# Altium footprint library Horizont_11_12_2017.PcbLib: 257 footprints (part 7 of 17)
Each footprint in its own frame and in the unit in brackets; x right, y up, seen from the top. Pads: shape width x height; smd on the part's side, far side on the other; paste and mask are expansions set on the pad; w line width, h text height; cw(c..) or ccw(c..) is an arc to the next point about the centre after c.
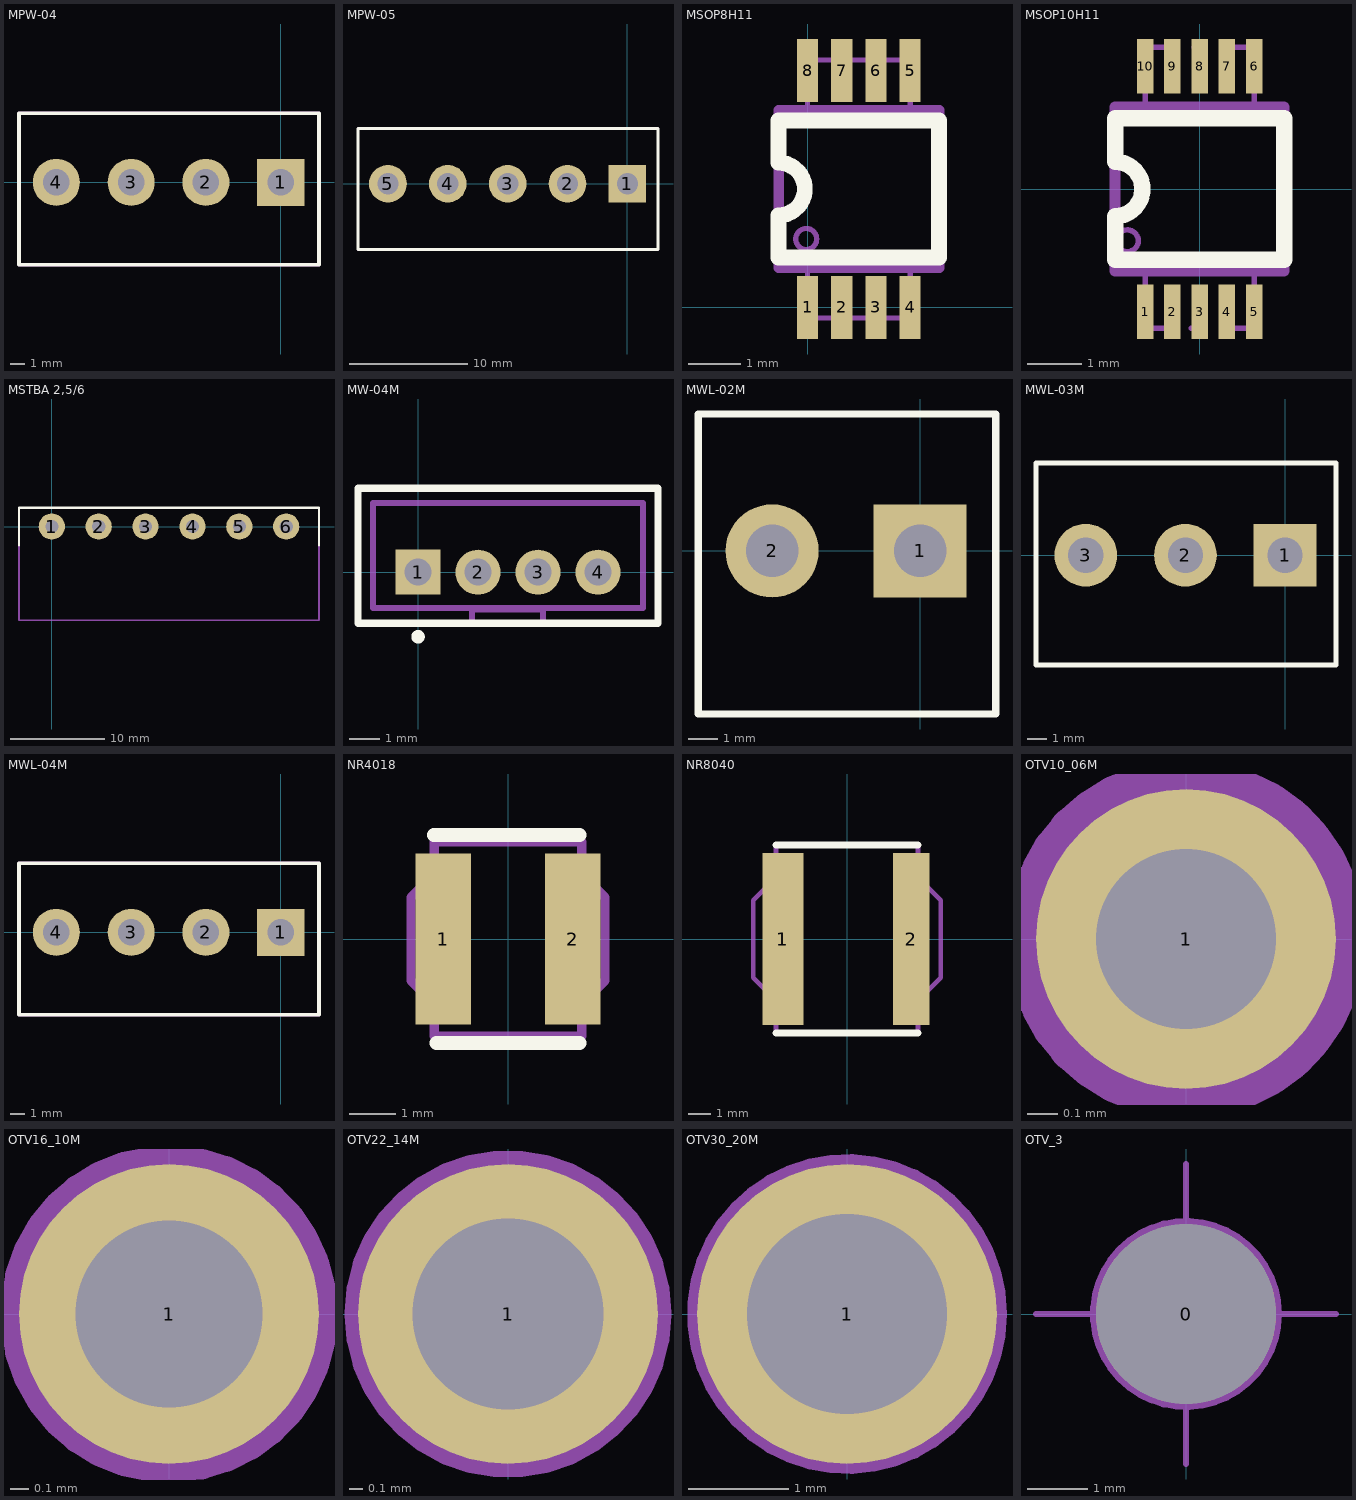
[diagram p6: the footprints below, top view; thin cyan lines are the x and y axes]

## MPW-04 [mm]
height 13.9
pads (4):
  rect 3.2x3.2 hole 1.8: 1(0,0)
  round 3.2 hole 1.8: 2(-5.08,0) 3(-10.16,0) 4(-15.24,0)
Top Overlay:
  lines w0.25: -17.78,-5.6 -17.78,4.7 2.6,4.7 2.6,-5.6 -17.78,-5.6
Mechanical 1:
  lines w0.2: -17.78,-5.6 2.6,-5.6 2.6,4.7 -17.78,4.7 -17.78,-5.6
  text "4" at -15.2,-0.5 h1.5
  text "1" at 0,-0.5 h1.5
  text ".Designator" at -10,3.1 h1.5
3D body "MPW-04.stp": height 13.7, standoff -3.3, extent -17.81,-5.57 2.57,4.63

## MPW-05 [mm]
height 13.9
pads (5):
  rect 3.2x3.2 hole 1.8: 1(0,0)
  round 3.2 hole 1.8: 2(-5.08,0) 3(-10.16,0) 4(-15.24,0) 5(-20.32,0)
Top Overlay:
  lines w0.25: -22.86,-5.6 -22.86,4.7 2.6,4.7 2.6,-5.6 -22.86,-5.6
Mechanical 1:
  lines w0.2: -22.86,-5.6 2.6,-5.6 2.6,4.7 -22.86,4.7 -22.86,-5.6
  text "5" at -20.6,-0.3 h1.5
  text "1" at 0,-0.5 h1.5
  text ".Designator" at -13,3.1 h1.5
3D body "MPW-05.stp": height 13.7, standoff -3.3, extent -22.89,-5.57 2.57,4.63

## MSOP8H11 [mm]
height 1.1
pads (8):
  rect 0.4x1.2 smd: 1(0,0) 2(0.65,0) 3(1.3,0) 4(1.95,0) 5(1.95,4.5) 6(1.3,4.5) 7(0.65,4.5) 8(0,4.5)
Top Overlay:
  lines w0.3: -0.55,0.95 2.5,0.95 2.5,3.55 -0.55,3.55 -0.55,2.75 cw(c-0.55,2.25) -0.55,1.75 -0.55,0.95
Mechanical 1:
  circle w0.1: c-0.025,1.3 r0.2
  lines w0.1: 0,0.75 0,-0.2 0.55,-0.2 ; 0,3.75 0,4.7 0.55,4.7 ; 0.85,-0.2 1.1,-0.2 ; 0.85,4.7 1.1,4.7 ; 1.4,-0.2 1.95,-0.2 1.95,0.75 ; 1.4,4.7 1.95,4.7 1.95,3.75
  lines w0.2: -0.55,0.75 2.5,0.75 2.5,3.75 -0.55,3.75 -0.55,0.75
  text ".Designator" at 0.2,5.18 h1.5
  text ".Comment" at -1.67,-1.45 h1.5
  text "8" at -0.127,2.413 h1.5
3D body "MSOP8h11.stp": height 1.11, standoff 0, extent -0.525,-0.2 2.475,4.7

## MSOP10H11 [mm]
height 1.1
pads (10):
  rect 0.3x1 smd: 1(-1,-2.25) 2(-0.5,-2.25) 3(0,-2.25) 4(0.5,-2.25) 5(1,-2.25) 6(1,2.25) 7(0.5,2.25) 8(0,2.25) 9(-0.5,2.25) 10(-1,2.25)
Top Overlay:
  lines w0.3: -1.55,-1.3 1.55,-1.3 1.55,1.3 -1.55,1.3 -1.55,0.5 cw(c-1.55,0) -1.55,-0.5 -1.55,-1.3
Mechanical 1:
  circle w0.1: c-1.325,-0.95 r0.2
  lines w0.1: -1.3,1.5 -1,1.5 -1,2.6 -0.45,2.6 ; -1,-1.5 -1,-1.65 -1,-2.55 -0.45,-2.55 ; -0.15,-2.55 0.1,-2.55 ; -0.1,2.6 0.1,2.6 ; 0.45,-2.55 1,-2.55 1,-1.5 ; 0.45,2.6 1,2.6 1,1.5 1.3,1.5
  lines w0.2: -1.55,-1.5 1.55,-1.5 1.55,1.5 -1.55,1.5 -1.55,-1.5
  text "10" at -1.427,0.163 h1.5
  text ".Comment" at -2.55,-3.95 h1.5
  text ".Designator" at -0.81,-0.95 h1.5
3D body "MSOP10h11.stp": height 1.11, standoff 0, extent -1.55,-2.55 1.55,2.55

## MSTBA 2,5/6 [mm]
height 8.35
pads (6):
  round 2.8 hole 1.4: 1(0,0) 2(5,0) 3(10,0) 4(15,0) 5(20,0) 6(25,0)
Top Overlay:
  lines w0.25: -3.5,-2 -3.5,2 28.5,2 28.5,-2
Mechanical 1:
  lines w0.2: -3.5,-10 28.5,-10 28.5,2 -3.5,2 -3.5,-10
  text "6" at 25,-0.5 h1.5
  text "1" at 0,-0.5 h1.5
  text ".Designator" at 10,-4 h1.5
3D body "MSTBA 2,5_6-G.STEP": height 8.35, standoff -3.6, extent -3.5,-10 28.5,2

## MW-04M [mm]
height 6
pads (4):
  rect 1.5x1.5 hole 0.9: 1(0,0)
  round 1.5 hole 0.9: 2(2,0) 3(4,0) 4(6,0)
Top Overlay:
  circle w0.25: c0,-2.15 r0.1
  lines w0.25: -2,-1.7 8,-1.7 8,2.8 -2,2.8 -2,-1.7
Mechanical 1:
  lines w0.2: 1.8,-1.7 1.8,-1.25 4.175,-1.25 4.175,-1.7 ; -2,-1.7 8,-1.7 8,2.8 -2,2.8 -2,-1.7 ; -1.5,-1.2 7.5,-1.2 7.5,2.3 -1.5,2.3 -1.5,-1.2
  text ".Designator" at 1.5,3.3 h1.5
  text "1" at -0.5,-0.5 h1.5
  text "4" at 5.7,-0.525 h1.5
3D body "MW-04M.STEP": height 6, standoff -3, extent -2,-1.7 8,2.8

## MWL-02M [mm]
height 13.9
pads (2):
  rect 3.2x3.2 hole 1.8: 1(0,0)
  round 3.2 hole 1.8: 2(-5.08,0)
Top Overlay:
  lines w0.25: -7.62,-5.6 -7.62,4.7 2.6,4.7 2.6,-5.6 -7.62,-5.6
Mechanical 1:
  lines w0.2: -7.62,-5.6 2.6,-5.6 2.6,4.7 -7.62,4.7 -7.62,-5.6
  text "2" at -5.334,-0.254 h1.5
  text "1" at 0,-0.5 h1.5
  text ".Designator" at -4.445,3.048 h1.5
3D body "MPW-02.stp": height 13.7, standoff -3.3, extent -7.65,-5.57 2.57,4.63

## MWL-03M [mm]
height 13.9
pads (3):
  rect 3.2x3.2 hole 1.8: 1(0,0)
  round 3.2 hole 1.8: 2(-5.08,0) 3(-10.16,0)
Top Overlay:
  lines w0.25: -12.7,-5.6 -12.7,4.7 2.6,4.7 2.6,-5.6 -12.7,-5.6
Mechanical 1:
  lines w0.2: -12.7,-5.6 2.6,-5.6 2.6,4.7 -12.7,4.7 -12.7,-5.6
  text "3" at -10.3,-0.35 h1.5
  text "1" at 0,-0.5 h1.5
  text ".Designator" at -7.62,3.175 h1.5
3D body "MPW-03.stp": height 13.7, standoff -3.3, extent -12.73,-5.57 2.57,4.63

## MWL-04M [mm]
height 13.9
pads (4):
  rect 3.2x3.2 hole 1.8: 1(0,0)
  round 3.2 hole 1.8: 2(-5.08,0) 3(-10.16,0) 4(-15.24,0)
Top Overlay:
  lines w0.25: -17.78,-5.6 -17.78,4.7 2.6,4.7 2.6,-5.6 -17.78,-5.6
Mechanical 1:
  lines w0.2: -17.78,-5.6 2.6,-5.6 2.6,4.7 -17.78,4.7 -17.78,-5.6
  text "4" at -15.2,-0.5 h1.5
  text "1" at 0,-0.5 h1.5
  text ".Designator" at -10,3.1 h1.5
3D body "MPW-04.stp": height 13.7, standoff -3.3, extent -17.81,-5.57 2.57,4.63

## NR4018 [mm]
height 1.8
pads (2):
  rect 1.2x3.7 smd: 1(-1.4,0) 2(1.4,0)
Top Overlay:
  lines w0.3: -1.6,2.25 1.55,2.25 ; -1.55,-2.25 1.55,-2.25
Mechanical 1:
  circle w0.1: c-1.4,-0.05 r0.1
  lines w0.2: -2.1,-0.9 -2.1,0.9 -1.6,1.4 -1.6,2.1 1.6,2.1 1.6,1.4 2.1,0.9 2.1,-0.9 1.6,-1.4 1.6,-2.1 -1.6,-2.1 -1.6,-1.4 -2.1,-0.9
  text ".Designator" at -0.65,-0.4 h1.5
3D body "NR4018.stp": height 1.8, standoff 0, extent -2.1,-2.1 2.1,2.1

## NR8040 [mm]
height 4
pads (2):
  rect 1.8x7.5 smd: 1(-2.8,0)
  rect 1.6x7.5 smd: 2(2.8,0)
Top Overlay:
  lines w0.3: -3.1,-4.1 3.1,-4.1 ; -3.1,4.1 3.1,4.1
Mechanical 1:
  circle w0.1: c-3.25,-0.1 r0.1
  lines w0.2: -4.1,-1.7 -3.1,-2.7 -3.1,-4.1 3.1,-4.1 3.1,-2.7 4.1,-1.7 4.1,1.7 3.1,2.7 3.1,4.1 -3.1,4.1 -3.1,2.7 -4.1,1.7 -4.1,-1.7
  text ".Designator" at -1.7,-0.4 h1.5
3D body "NR8040.stp": height 4, standoff 0, extent -4.1,-4.1 4.1,4.1

## OTV10_06M [mm]
pads (1):
  round 1 hole 0.6: 1(0,0)
Mechanical 1:
  circle w0.2: c0,0 r0.5
  text ".Designator" at -0.8,1.18 h1.5
Mechanical 2:
  circle w0.2: c0,0 r0.5

## OTV16_10M [mm]
pads (1):
  round 1.6 hole 1: 1(0,0)
Mechanical 1:
  circle w0.2: c0,0 r0.8
  text ".Designator" at -0.8,1.18 h1.5
Mechanical 2:
  circle w0.2: c0,0 r0.8
3D body "User Library-plh2-1_asm.STEP": height 10, standoff -2, extent -1,-1 1,1

## OTV22_14M [mm]
pads (1):
  round 2.2 hole 1.4: 1(0,0)
Mechanical 1:
  circle w0.2: c0,0 r1.1
  text ".Designator" at -0.8,1.68 h1.5
Mechanical 2:
  circle w0.2: c0,0 r1.1

## OTV30_20M [mm]
pads (1):
  round 3 hole 2: 1(0,0)
Mechanical 1:
  circle w0.2: c0,0 r1.5
  text ".Designator" at -0.8,2.18 h1.5
Mechanical 2:
  circle w0.2: c0,0 r1.5

## OTV_3 [mm]
pads (1):
  round 3 hole 3 unplated mask+1.5: 0(0,0)
Mechanical 1:
  circle w0.2: c0,0 r1.5
  lines w0.1: -2.5,0 2.5,0 ; 0,-2.5 0,2.5
Mechanical 2:
  circle w0.2: c0,0 r1.5
  lines w0.1: -2.5,0 2.5,0 ; 0,-2.5 0,2.5